# Altium footprint library Connectors.PcbLib: 70 footprints (part 5 of 5)
Each footprint in its own frame and in the unit in brackets; x right, y up, seen from the top. Pads: shape width x height; smd on the part's side, far side on the other; paste and mask are expansions set on the pad; w line width, h text height; cw(c..) or ccw(c..) is an arc to the next point about the centre after c.
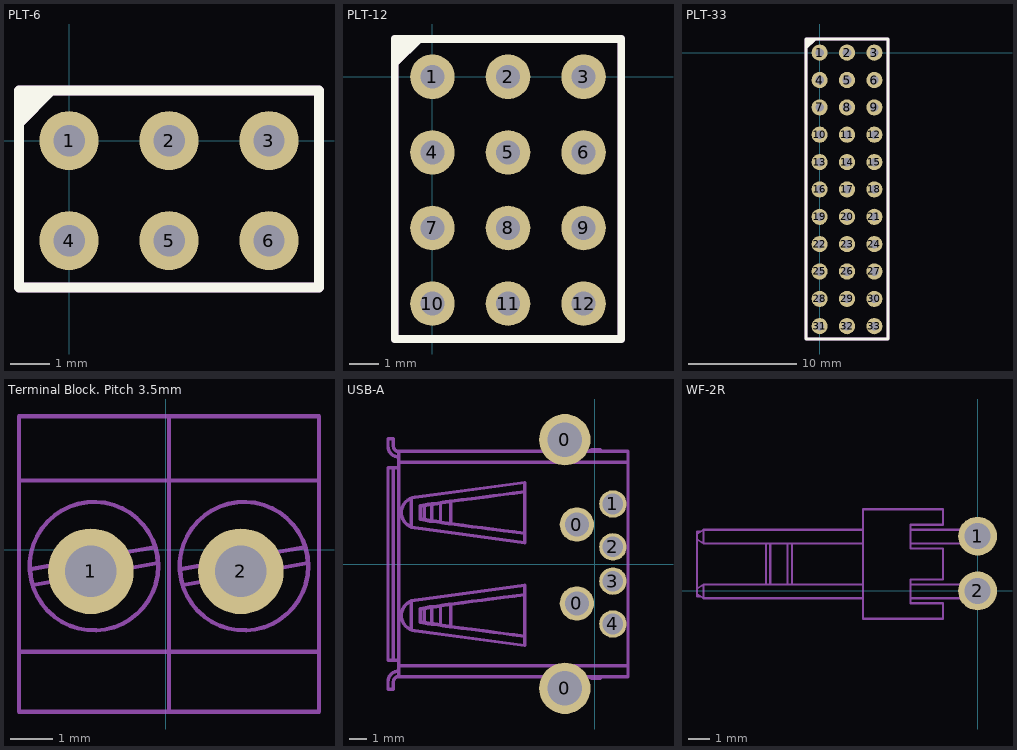
[diagram p4: the footprints below, top view; thin cyan lines are the x and y axes]

## PLT-6 [mm]
pads (6):
  round 1.5 hole 0.8: 1(0,0) 2(2.54,0) 3(5.08,0) 4(0,-2.54) 5(2.54,-2.54) 6(5.08,-2.54)
Top Overlay:
  region: -0.28,1.27 -1.27,0.28 -1.27,1.27
  lines w0.254: -1.27,-3.73 6.35,-3.73 6.35,1.27 -1.27,1.27 -1.27,-3.73
Top Assembly:
  region: -0.28,1.27 -1.27,0.28 -1.27,1.27
  lines w0.254: -1.27,-3.73 6.35,-3.73 6.35,1.27 -1.27,1.27 -1.27,-3.73
3D body "User Library-PLD-2.step": height 8.5, standoff -3, extent -1.27,-3.73 1.27,1.27
3D body "User Library-PLD-2.step": height 8.5, standoff -3, extent 1.27,-3.73 3.81,1.27
3D body "User Library-PLD-2.step": height 8.5, standoff -3, extent 3.81,-3.73 6.35,1.27

## PLT-12 [mm]
pads (12):
  round 1.5 hole 0.8: 1(0,0) 2(2.54,0) 3(5.08,0) 4(0,-2.54) 5(2.54,-2.54) 6(5.08,-2.54) 7(0,-5.08) 8(2.54,-5.08) 9(5.08,-5.08) 10(0,-7.62) 11(2.54,-7.62) 12(5.08,-7.62)
Top Overlay:
  region: -0.28,1.27 -1.27,0.28 -1.27,1.27
  lines w0.254: -1.27,-8.81 -1.27,1.27 6.35,1.27 6.35,-8.81 -1.27,-8.81
Top Assembly:
  region: -0.28,1.27 -1.27,0.28 -1.27,1.27
  lines w0.254: -1.27,-8.81 -1.27,1.27 6.35,1.27 6.35,-8.81 -1.27,-8.81
3D body "User Library-PLD-2.step": height 8.5, standoff -3, extent -1.27,-3.73 1.27,1.27
3D body "User Library-PLD-2.step": height 8.5, standoff -3, extent -1.27,-8.81 1.27,-3.81
3D body "User Library-PLD-2.step": height 8.5, standoff -3, extent 1.27,-3.73 3.81,1.27
3D body "User Library-PLD-2.step": height 8.5, standoff -3, extent 1.27,-8.81 3.81,-3.81
3D body "User Library-PLD-2.step": height 8.5, standoff -3, extent 3.81,-3.73 6.35,1.27
3D body "User Library-PLD-2.step": height 8.5, standoff -3, extent 3.81,-8.81 6.35,-3.81

## PLT-33 [mm]
pads (33):
  round 1.5 hole 0.8: 1(0,0) 2(2.54,0) 3(5.08,0) 4(0,-2.54) 5(2.54,-2.54) 6(5.08,-2.54) 7(0,-5.08) 8(2.54,-5.08) 9(5.08,-5.08) 10(0,-7.62) 11(2.54,-7.62) 12(5.08,-7.62) 13(0,-10.16) 14(2.54,-10.16) 15(5.08,-10.16) 16(0,-12.7) 17(2.54,-12.7) 18(5.08,-12.7) 19(0,-15.24) 20(2.54,-15.24) 21(5.08,-15.24) 22(0,-17.78) 23(2.54,-17.78) 24(5.08,-17.78) 25(0,-20.32) 26(2.54,-20.32) 27(5.08,-20.32) 28(0,-22.86) 29(2.54,-22.86) 30(5.08,-22.86) 31(0,-25.4) 32(2.54,-25.4) 33(5.08,-25.4)
Top Overlay:
  region: -0.28,1.27 -1.27,0.28 -1.27,1.27
  lines w0.254: -1.27,-26.59 6.35,-26.59 6.35,1.27 -1.27,1.27 -1.27,-26.59
Top Assembly:
  region: -0.28,1.27 -1.27,0.28 -1.27,1.27
  lines w0.254: -1.27,-26.59 -1.27,1.27 6.35,1.27 6.35,-26.59 -1.27,-26.59
3D body "User Library-PLD-2.step": height 8.5, standoff -3, extent 3.81,-26.59 6.35,-21.59
3D body "User Library-PLD-2.step": height 8.5, standoff -3, extent 1.27,-26.59 3.81,-21.59
3D body "User Library-PLD-2.step": height 8.5, standoff -3, extent -1.27,-26.59 1.27,-21.59
3D body "User Library-PLD-2.step": height 8.5, standoff -3, extent 3.81,-24.05 6.35,-19.05
3D body "User Library-PLD-2.step": height 8.5, standoff -3, extent 3.81,-18.97 6.35,-13.97
3D body "User Library-PLD-2.step": height 8.5, standoff -3, extent 3.81,-13.89 6.35,-8.89
3D body "User Library-PLD-2.step": height 8.5, standoff -3, extent 3.81,-8.81 6.35,-3.81
3D body "User Library-PLD-2.step": height 8.5, standoff -3, extent 3.81,-3.73 6.35,1.27
3D body "User Library-PLD-2.step": height 8.5, standoff -3, extent 1.27,-24.05 3.81,-19.05
3D body "User Library-PLD-2.step": height 8.5, standoff -3, extent 1.27,-18.97 3.81,-13.97
3D body "User Library-PLD-2.step": height 8.5, standoff -3, extent 1.27,-13.89 3.81,-8.89
3D body "User Library-PLD-2.step": height 8.5, standoff -3, extent 1.27,-8.81 3.81,-3.81
3D body "User Library-PLD-2.step": height 8.5, standoff -3, extent 1.27,-3.73 3.81,1.27
3D body "User Library-PLD-2.step": height 8.5, standoff -3, extent -1.27,-24.05 1.27,-19.05
3D body "User Library-PLD-2.step": height 8.5, standoff -3, extent -1.27,-18.97 1.27,-13.97
3D body "User Library-PLD-2.step": height 8.5, standoff -3, extent -1.27,-13.89 1.27,-8.89
3D body "User Library-PLD-2.step": height 8.5, standoff -3, extent -1.27,-8.81 1.27,-3.81
3D body "User Library-PLD-2.step": height 8.5, standoff -3, extent -1.27,-3.73 1.27,1.27

## Terminal Block. Pitch 3.5mm [mm]
pads (2):
  round 2 hole 1.2: 1(-1.75,-0.5) 2(1.75,-0.5)
Top Assembly:
  circle w0.1: c-1.677,-0.38 r1.5
  circle w0.1: c1.823,-0.38 r1.5
  lines w0.1: -3.427,-2.38 -3.427,-3.78 -3.027,-3.78 -0.327,-3.78 0.073,-3.78 ; -3.427,-2.38 0.073,-2.38 ; -3.427,-2.38 -3.427,1.62 ; -3.427,1.62 -3.427,3.12 0.073,3.12 ; -3.427,1.62 0.073,1.62 ; -2.455,-0.325 cw(c-1.677,-0.38) -1.811,0.389 cw(c-1.677,-0.38) -0.963,-0.064 ; -2.455,-0.325 -3.165,-0.45 ccw(c-1.677,-0.38) -3.1,-0.819 -2.39,-0.695 ; -2.455,-0.325 -0.963,-0.064 ; -2.39,-0.695 ccw(c-1.677,-0.38) -1.542,-1.148 ccw(c-1.677,-0.38) -0.898,-0.434 ; -2.39,-0.695 -0.898,-0.434 ; -0.963,-0.064 -0.253,0.06 cw(c-1.677,-0.38) -0.188,-0.309 -0.898,-0.434 ; 0.073,-3.78 0.073,-2.38 ; 0.073,-3.78 0.473,-3.78 3.173,-3.78 3.573,-3.78 3.573,-2.38 ; 0.073,-2.38 3.573,-2.38 ; 0.073,-2.38 0.073,1.62 ; 0.073,1.62 3.573,1.62 ; 0.073,1.62 0.073,3.12 ; 0.073,3.12 3.573,3.12 3.573,1.62 ; 1.045,-0.325 cw(c1.823,-0.38) 1.689,0.389 cw(c1.823,-0.38) 2.537,-0.064 ; 1.045,-0.325 0.335,-0.45 ccw(c1.823,-0.38) 0.4,-0.819 1.11,-0.695 ; 1.045,-0.325 2.537,-0.064 ; 1.11,-0.695 ccw(c1.823,-0.38) 1.958,-1.148 ccw(c1.823,-0.38) 2.602,-0.434 ; 1.11,-0.695 2.602,-0.434 ; 2.537,-0.064 3.247,0.06 cw(c1.823,-0.38) 3.312,-0.309 2.602,-0.434 ; 3.573,-2.38 3.573,1.62
3D body "User Library-KF350-2P.STEP": height 9.3, standoff -2.1, extent -3.5,-3.725 3.5,3.175

## USB-A [mm]
pads (8):
  round 3 hole 2: 0(-1.75,-7.25) 0(-1.75,7.25)
  round 2 hole 1.4: 0(-1.05,-2.3) 0(-1.05,2.3)
  round 1.6 hole 1.2: 1(1.05,3.5) 2(1.05,1) 3(1.05,-1) 4(1.05,-3.5)
Top Assembly:
  drawing of 640 lines, arcs and shapes, not listed
3D body "72w2538_292303-4.stp": height 8.62, standoff -2.65, extent -12,-8.117 2,8.117

## WF-2R [mm]
pads (2):
  round 1.8 hole 1.2: 1(0,2.54) 2(0,0)
Top Assembly:
  lines w0.1: -12.846,-0.251 -13.011,-0.251 -13.011,-0.141 ; -12.846,2.749 -13.011,2.749 -13.011,2.639 ; -9.811,0.299 -9.811,2.199 ; -9.611,0.299 -9.611,2.199 ; -8.811,0.299 -8.811,2.199 ; -8.611,0.299 -8.611,2.199 ; -5.311,-0.341 -12.711,-0.341 ; -5.311,0.299 -12.711,0.299 ; -5.311,2.199 -12.711,2.199 ; -5.311,2.839 -12.711,2.839 ; -3.111,-0.341 -0.631,-0.341 ; -3.111,0.299 -0.631,0.299 ; -3.111,2.199 -0.631,2.199 ; -3.111,2.839 -0.631,2.839 ; -13.011,-0.141 -12.711,-0.341 ; -13.011,-0.141 -13.011,0.099 ; -13.011,0.099 -13.011,2.399 ; -13.011,0.099 -12.711,0.299 ; -13.011,2.399 -12.711,2.199 ; -13.011,2.399 -13.011,2.639 ; -13.011,2.639 -12.711,2.839 ; -12.711,-0.341 -12.711,0.299 ; -12.711,2.199 -12.711,2.839 ; -0.631,-0.341 -0.631,0.299 ; -0.631,-0.341 0.189,-0.341 0.189,0.299 -0.631,0.299 ; -0.631,2.199 -0.631,2.839 ; -0.631,2.199 0.189,2.199 0.189,2.839 -0.631,2.839 ; -5.311,-1.291 -5.311,3.789 -1.611,3.789 -1.611,3.069 -3.111,3.069 -3.111,1.969 -1.611,1.969 -1.611,0.529 -3.111,0.529 -3.111,-0.571 -1.611,-0.571 -1.611,-1.291 -5.311,-1.291
3D body "User Library-WF-2R.step": height 5.8, standoff -3.4, extent -12.95,-1.27 0.25,3.81